# Altium footprint library LukaLIBRARY.PcbLib: 784 footprints (part 25 of 49)
Each footprint in its own frame and in the unit in brackets; x right, y up, seen from the top. Pads: shape width x height; smd on the part's side, far side on the other; paste and mask are expansions set on the pad; w line width, h text height; cw(c..) or ccw(c..) is an arc to the next point about the centre after c.
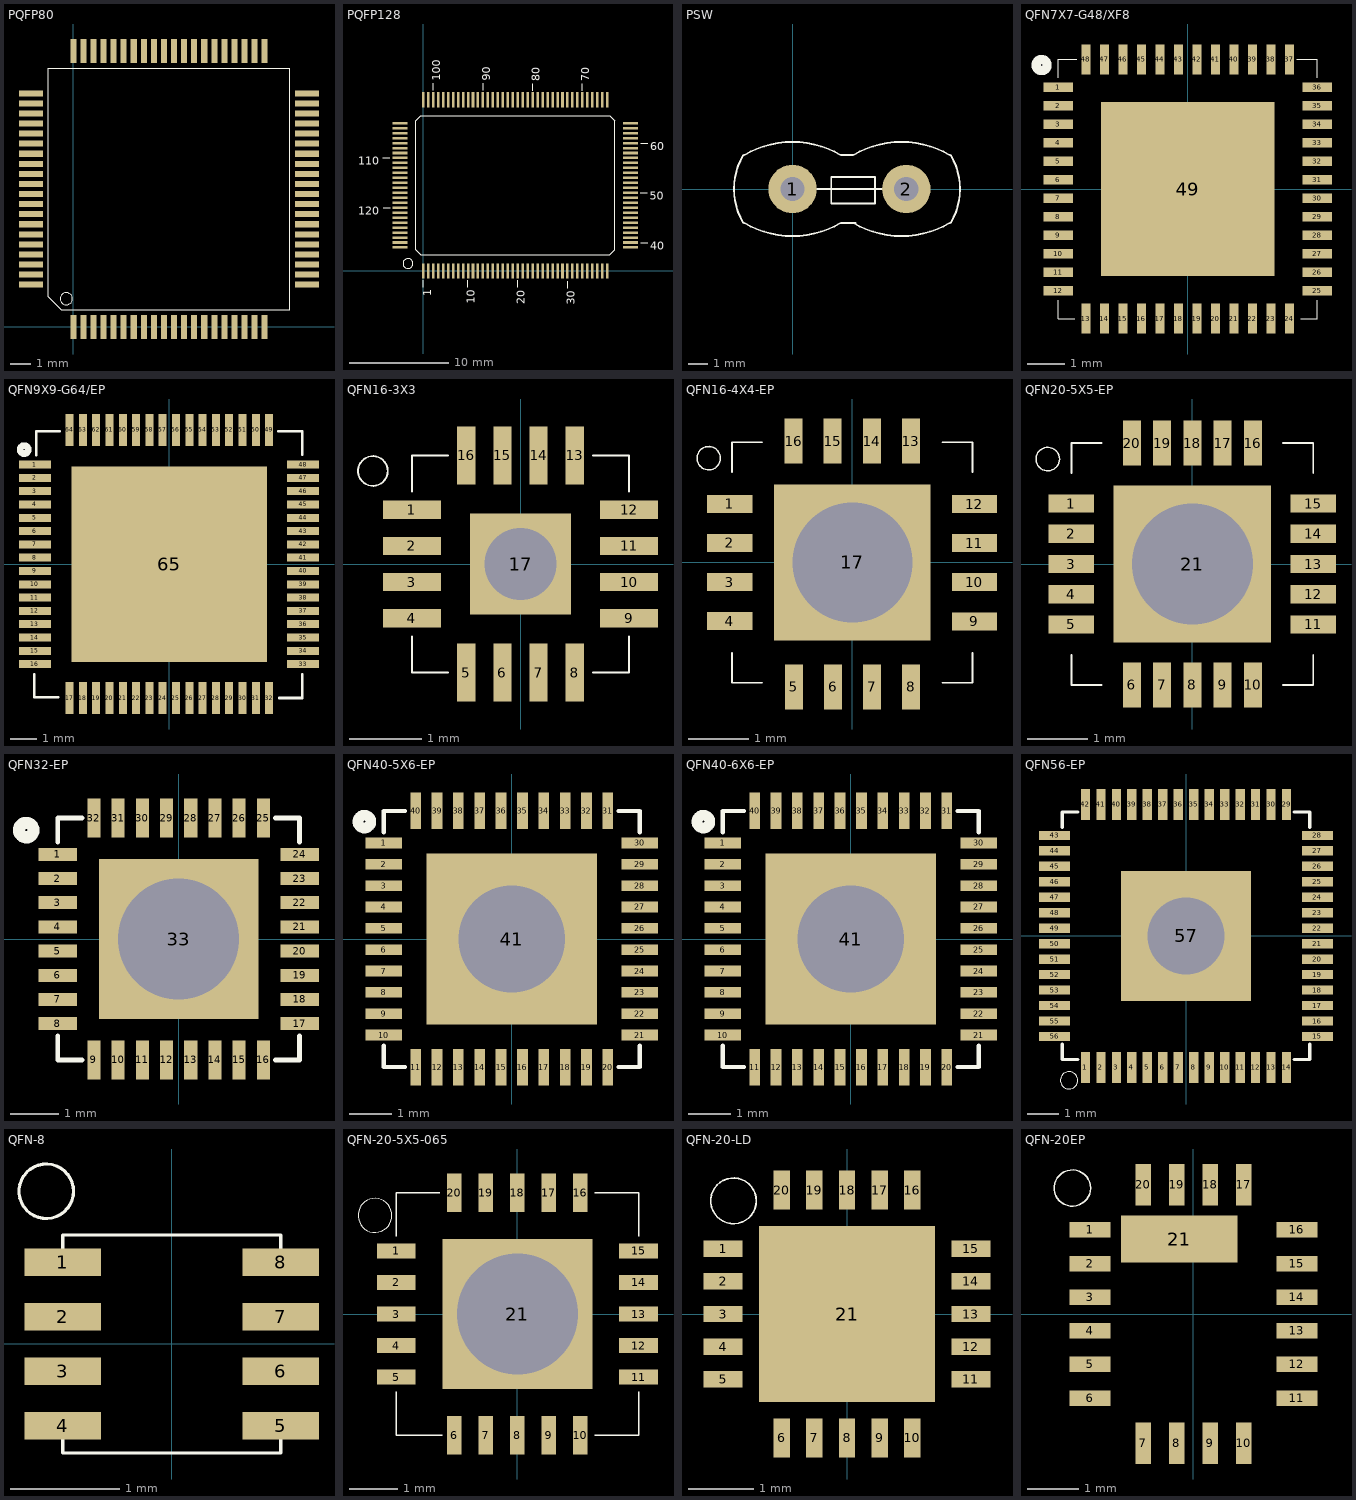
[diagram p24: the footprints below, top view; thin cyan lines are the x and y axes]

## PQFP80 [mm]
pads (80):
  rect 0.3x1.2 smd: 1(0,0) 2(0.5,0) 3(1,0) 4(1.5,0) 5(2,0) 6(2.5,0) 7(3,0) 8(3.5,0) 9(4,0) 10(4.5,0) 11(5,0) 12(5.5,0) 13(6,0) 14(6.5,0) 15(7,0) 16(7.5,0) 17(8,0) 18(8.5,0) 19(9,0) 20(9.5,0) 41(9.5,13.7) 42(9,13.7) 43(8.5,13.7) 44(8,13.7) 45(7.5,13.7) 46(7,13.7) 47(6.5,13.7) 48(6,13.7) 49(5.5,13.7) 50(5,13.7) 51(4.5,13.7) 52(4,13.7) 53(3.5,13.7) 54(3,13.7) 55(2.5,13.7) 56(2,13.7) 57(1.5,13.7) 58(1,13.7) 59(0.5,13.7) 60(0,13.7)
  rect 1.2x0.3 smd: 21(11.6,2.1) 22(11.6,2.6) 23(11.6,3.1) 24(11.6,3.6) 25(11.6,4.1) 26(11.6,4.6) 27(11.6,5.1) 28(11.6,5.6) 29(11.6,6.1) 30(11.6,6.6) 31(11.6,7.1) 32(11.6,7.6) 33(11.6,8.1) 34(11.6,8.6) 35(11.6,9.1) 36(11.6,9.6) 37(11.6,10.1) 38(11.6,10.6) 39(11.6,11.1) 40(11.6,11.6) 61(-2.1,11.6) 62(-2.1,11.1) 63(-2.1,10.6) 64(-2.1,10.1) 65(-2.1,9.6) 66(-2.1,9.1) 67(-2.1,8.6) 68(-2.1,8.1) 69(-2.1,7.6) 70(-2.1,7.1) 71(-2.1,6.6) 72(-2.1,6.1) 73(-2.1,5.6) 74(-2.1,5.1) 75(-2.1,4.6) 76(-2.1,4.1) 77(-2.1,3.6) 78(-2.1,3.1) 79(-2.1,2.6) 80(-2.1,2.1)
Top Overlay:
  circle w0.025: c-0.35,1.4 r0.3
  lines w0.025: -1.25,1.5 -0.6,0.85 10.75,0.85 10.75,12.85 -1.25,12.85 -1.25,1.5

## PQFP128 [mil]
pads (128):
  rect 10x60 smd mask-1000: 1(0,0) 2(19.68,0) 3(39.37,0) 4(59.06,0) 5(78.74,0) 6(98.43,0) 7(118.11,0) 8(137.8,0) 9(157.48,0) 10(177.17,0) 11(196.85,0) 12(216.54,0) 13(236.22,0) 14(255.91,0) 15(275.59,0) 16(295.28,0) 17(314.96,0) 18(334.65,0) 19(354.33,0) 20(374.02,0) 21(393.7,0) 22(413.39,0) 23(433.07,0) 24(452.76,0) 25(472.44,0) 26(492.13,0) 27(511.81,0) 28(531.5,0) 29(551.18,0) 30(570.87,0) 31(590.55,0) 32(610.24,0) 33(629.92,0) 34(649.61,0) 35(669.29,0) 36(688.98,0) 37(708.66,0) 38(728.35,0) 65(728.35,677.17) 66(708.66,677.17) 67(688.98,677.17) 68(669.29,677.17) 69(649.61,677.17) 70(629.92,677.17) 71(610.24,677.17) 72(590.55,677.17) 73(570.87,677.17) 74(551.18,677.17) 75(531.5,677.17) 76(511.81,677.17) 77(492.13,677.17) 78(472.44,677.17) 79(452.76,677.17) 80(433.07,677.17) 81(413.39,677.17) 82(393.7,677.17) 83(374.02,677.17) 84(354.33,677.17) 85(334.65,677.17) 86(314.96,677.17) 87(295.28,677.17) 88(275.59,677.17) 89(255.91,677.17) 90(236.22,677.17) 91(216.54,677.17) 92(196.85,677.17) 93(177.17,677.17) 94(157.48,677.17) 95(137.8,677.17) 96(118.11,677.17) 97(98.43,677.17) 98(78.74,677.17) 99(59.06,677.17) 100(39.37,677.17) 101(19.68,677.17) 102(0,677.17)
  rect 60x10 smd mask-1000: 39(820.87,92.52) 40(820.87,112.2) 41(820.87,131.89) 42(820.87,151.57) 43(820.87,171.26) 44(820.87,190.94) 45(820.87,210.63) 46(820.87,230.31) 47(820.87,250) 48(820.87,269.69) 49(820.87,289.37) 50(820.87,309.06) 51(820.87,328.74) 52(820.87,348.43) 53(820.87,368.11) 54(820.87,387.8) 55(820.87,407.48) 56(820.87,427.17) 57(820.87,446.85) 58(820.87,466.54) 59(820.87,486.22) 60(820.87,505.91) 61(820.87,525.59) 62(820.87,545.28) 63(820.87,564.96) 64(820.87,584.65) 103(-92.52,584.65) 104(-92.52,564.96) 105(-92.52,545.28) 106(-92.52,525.59) 107(-92.52,505.91) 108(-92.52,486.22) 109(-92.52,466.54) 110(-92.52,446.85) 111(-92.52,427.17) 112(-92.52,407.48) 113(-92.52,387.8) 114(-92.52,368.11) 115(-92.52,348.43) 116(-92.52,328.74) 117(-92.52,309.06) 118(-92.52,289.37) 119(-92.52,269.69) 120(-92.52,250) 121(-92.52,230.31) 122(-92.52,210.63) 123(-92.52,190.94) 124(-92.52,171.26) 125(-92.52,151.57) 126(-92.52,131.89) 127(-92.52,112.2) 128(-92.52,92.52)
Top Overlay:
  circle w1: c-60.63,28.94 r19.69
  lines w1: -29.53,82.68 -9.84,62.99 738.19,62.99 757.87,82.68 757.87,594.49 738.19,614.17 -9.84,614.17 -29.53,594.49 -29.53,82.68
  lines w3.94: -160.04,447.64 -132.48,447.64 ; -158.07,249.8 -130.51,249.8 ; 0.39,-64.17 0.39,-36.61 ; 38.78,714.37 38.78,741.93 ; 176.57,-64.17 176.57,-36.61 ; 236.61,714.37 236.61,741.93 ; 373.43,-65.16 373.43,-37.6 ; 433.46,713.39 433.46,740.94 ; 571.26,-68.11 571.26,-40.55 ; 630.32,713.39 630.32,740.94 ; 859.65,308.86 887.2,308.86 ; 860.63,112.01 888.19,112.01 ; 860.63,505.71 888.19,505.71
  text "1" at 30.91,-101.57 h31.25
  text "100" at 66.34,751.77 h31.25
  text "10" at 204.13,-131.1 h31.25
  text "90" at 264.17,751.77 h31.25
  text "30" at 598.82,-135.04 h31.25
  text "70" at 657.87,750.79 h31.25
  text "80" at 461.02,750.79 h31.25
  text "40" at 898.03,84.45 h31.25
  text "60" at 898.03,478.15 h31.25
  text "50" at 897.05,281.3 h31.25
  text "20" at 400.98,-132.09 h31.25
  text "120" at -256.5,222.24 h31.25
  text "110" at -258.46,420.08 h31.25
Top Solder:
  drawing of 128 lines, arcs and shapes, not listed

## PSW [mil]
pads (2):
  round 100 hole 50 mask-1000: 1(0,0) 2(235,0)
Top Overlay:
  lines w3.94: -102.04,-68.94 cw(c15,0) -102.04,68.94 ; -100.1,-69.94 ccw(c0,100) 100.1,-69.94 ; -100.1,69.94 cw(c0,-100) 100.1,69.94 ; 50,0 185,0 ; 100,-70 130,-70 ; 100,70 125,70 ; 124.9,-69.94 ccw(c225,100) 325.1,-69.94 ; 124.9,69.94 cw(c225,-100) 325.1,69.94 ; 327.04,-68.94 ccw(c210,0) 327.04,68.94 ; 80,-30 170,-30 170,25 80,25 80,-30
Top Solder:
  region: 235,50.43 221.95,48.71 209.78,43.67 199.34,35.66 191.33,25.22 186.29,13.05 184.57,0 186.29,-13.05 191.33,-25.22 199.34,-35.66 209.78,-43.67 221.95,-48.71 235,-50.43 248.05,-48.71 260.22,-43.67 270.66,-35.66 278.67,-25.22 283.71,-13.05 285.43,0 283.71,13.05 278.67,25.22 270.66,35.66 260.22,43.67 248.05,48.71
  region: 0,50.43 -13.05,48.71 -25.22,43.67 -35.66,35.66 -43.67,25.22 -48.71,13.05 -50.43,0 -48.71,-13.05 -43.67,-25.22 -35.66,-35.66 -25.22,-43.67 -13.05,-48.71 0,-50.43 13.05,-48.71 25.22,-43.67 35.66,-35.66 43.67,-25.22 48.71,-13.05 50.43,0 48.71,13.05 43.67,25.22 35.66,35.66 25.22,43.67 13.05,48.71
Bottom Solder:
  region: 235,50.43 221.95,48.71 209.78,43.67 199.34,35.66 191.33,25.22 186.29,13.05 184.57,0 186.29,-13.05 191.33,-25.22 199.34,-35.66 209.78,-43.67 221.95,-48.71 235,-50.43 248.05,-48.71 260.22,-43.67 270.66,-35.66 278.67,-25.22 283.71,-13.05 285.43,0 283.71,13.05 278.67,25.22 270.66,35.66 260.22,43.67 248.05,48.71
  region: 0,50.43 -13.05,48.71 -25.22,43.67 -35.66,35.66 -43.67,25.22 -48.71,13.05 -50.43,0 -48.71,-13.05 -43.67,-25.22 -35.66,-35.66 -25.22,-43.67 -13.05,-48.71 0,-50.43 13.05,-48.71 25.22,-43.67 35.66,-35.66 43.67,-25.22 48.71,-13.05 50.43,0 48.71,13.05 43.67,25.22 35.66,35.66 25.22,43.67 13.05,48.71

## QFN7X7-G48/XF8 [mm]
pads (49):
  rect 0.8x0.254 smd mask-25.4: 1(-3.5,2.75) 2(-3.5,2.25) 3(-3.5,1.75) 4(-3.5,1.25) 5(-3.5,0.75) 6(-3.5,0.25) 7(-3.5,-0.25) 8(-3.5,-0.75) 9(-3.5,-1.25) 10(-3.5,-1.75) 11(-3.5,-2.25) 12(-3.5,-2.75) 25(3.5,-2.75) 26(3.5,-2.25) 27(3.5,-1.75) 28(3.5,-1.25) 29(3.5,-0.75) 30(3.5,-0.25) 31(3.5,0.25) 32(3.5,0.75) 33(3.5,1.25) 34(3.5,1.75) 35(3.5,2.25) 36(3.5,2.75)
  rect 0.254x0.8 smd mask-25.4: 13(-2.75,-3.5) 14(-2.25,-3.5) 15(-1.75,-3.5) 16(-1.25,-3.5) 17(-0.75,-3.5) 18(-0.25,-3.5) 19(0.25,-3.5) 20(0.75,-3.5) 21(1.25,-3.5) 22(1.75,-3.5) 23(2.25,-3.5) 24(2.75,-3.5) 37(2.75,3.5) 38(2.25,3.5) 39(1.75,3.5) 40(1.25,3.5) 41(0.75,3.5) 42(0.25,3.5) 43(-0.25,3.5) 44(-0.75,3.5) 45(-1.25,3.5) 46(-1.75,3.5) 47(-2.25,3.5) 48(-2.75,3.5)
  rect 4.7x4.7 smd mask-25.4: 49(0,0)
Top Overlay:
  circle w0.25: c-3.95,3.35 r0.15
  lines w0.025: -3.5,-3 -3.5,-3.5 -3.05,-3.5 ; -3.5,3 -3.5,3.5 -3,3.5 ; 2.95,3.5 3.5,3.5 3.5,3 ; 3.05,-3.5 3.5,-3.5 3.5,-3
Top Solder:
  drawing of 49 lines, arcs and shapes, not listed

## QFN9X9-G64/EP [mm]
pads (65):
  rect 1.2x0.3 smd mask-25.4: 1(-5.05,3.75) 2(-5.05,3.25) 3(-5.05,2.75) 4(-5.05,2.25) 5(-5.05,1.75) 6(-5.05,1.25) 7(-5.05,0.75) 8(-5.05,0.25) 9(-5.05,-0.25) 10(-5.05,-0.75) 11(-5.05,-1.25) 12(-5.05,-1.75) 13(-5.05,-2.25) 14(-5.05,-2.75) 15(-5.05,-3.25) 16(-5.05,-3.75) 33(5.025,-3.75) 34(5.025,-3.25) 35(5.025,-2.75) 36(5.025,-2.25) 37(5.025,-1.75) 38(5.025,-1.25) 39(5.025,-0.75) 40(5.025,-0.25) 41(5.025,0.25) 42(5.025,0.75) 43(5.025,1.25) 44(5.025,1.75) 45(5.025,2.25) 46(5.025,2.75) 47(5.025,3.25) 48(5.025,3.75)
  rect 0.3x1.2 smd mask-25.4: 17(-3.75,-5.025) 18(-3.25,-5.025) 19(-2.75,-5.025) 20(-2.25,-5.025) 21(-1.75,-5.025) 22(-1.25,-5.025) 23(-0.75,-5.025) 24(-0.25,-5.025) 25(0.25,-5.025) 26(0.75,-5.025) 27(1.25,-5.025) 28(1.75,-5.025) 29(2.25,-5.025) 30(2.75,-5.025) 31(3.25,-5.025) 32(3.75,-5.025) 49(3.75,5.05) 50(3.25,5.05) 51(2.75,5.05) 52(2.25,5.05) 53(1.75,5.05) 54(1.25,5.05) 55(0.75,5.05) 56(0.25,5.05) 57(-0.25,5.05) 58(-0.75,5.05) 59(-1.25,5.05) 60(-1.75,5.05) 61(-2.25,5.05) 62(-2.75,5.05) 63(-3.25,5.05) 64(-3.75,5.05)
  rect 7.35x7.35 smd mask-25.4: 65(0,0)
Top Overlay:
  circle w0.25: c-5.455,4.311 r0.15
  lines w0.1: -5.075,-4.125 -5.075,-5 -4.175,-5 ; -5,4.1 -5,5 -4.125,5 ; 4.1,5 5,5 5,4.125 ; 4.125,-5.025 5,-5.025 5,-4.125
Top Solder:
  drawing of 65 lines, arcs and shapes, not listed

## QFN16-3X3 [mm]
pads (17):
  rect 0.8x0.25 smd mask-25.4: 1(-1.5,0.75) 2(-1.5,0.25) 3(-1.5,-0.25) 4(-1.5,-0.75) 9(1.5,-0.75) 10(1.5,-0.25) 11(1.5,0.25) 12(1.5,0.75)
  rect 0.25x0.8 smd mask-25.4: 5(-0.75,-1.5) 6(-0.25,-1.5) 7(0.25,-1.5) 8(0.75,-1.5) 13(0.75,1.5) 14(0.25,1.5) 15(-0.25,1.5) 16(-0.75,1.5)
  rect 1.4x1.4 hole 1 unplated mask-25.4: 17(0,0)
Top Overlay:
  circle w0.025: c-2.04,1.285 r0.206
  lines w0.025: -1.5,-1 -1.5,-1.5 -1,-1.5 ; -1.5,1 -1.5,1.5 -1,1.5 ; 1,-1.5 1.5,-1.5 1.5,-1 ; 1,1.5 1.5,1.5 1.5,1
Top Solder:
  region: -0.7,-0.7 0.7,-0.7 0.7,0.7 -0.7,0.7
  region: 1.9,-0.4 1.9,-0.1 1.1,-0.1 1.1,-0.4
  region: 1.9,0.1 1.9,0.4 1.1,0.4 1.1,0.1
  region: 1.9,0.6 1.9,0.9 1.1,0.9 1.1,0.6
  region: 0.6,1.1 0.9,1.1 0.9,1.9 0.6,1.9
  region: 0.6,-1.9 0.9,-1.9 0.9,-1.1 0.6,-1.1
  region: 1.9,-0.9 1.9,-0.6 1.1,-0.6 1.1,-0.9
  region: 0.1,1.1 0.4,1.1 0.4,1.9 0.1,1.9
  region: -0.4,1.1 -0.1,1.1 -0.1,1.9 -0.4,1.9
  region: -0.6,1.9 -0.9,1.9 -0.9,1.1 -0.6,1.1
  region: -1.1,-0.4 -1.1,-0.1 -1.9,-0.1 -1.9,-0.4
  region: -1.1,0.1 -1.1,0.4 -1.9,0.4 -1.9,0.1
  region: -1.1,0.6 -1.1,0.9 -1.9,0.9 -1.9,0.6
  region: 0.1,-1.9 0.4,-1.9 0.4,-1.1 0.1,-1.1
  region: -0.4,-1.9 -0.1,-1.9 -0.1,-1.1 -0.4,-1.1
  region: -0.6,-1.1 -0.9,-1.1 -0.9,-1.9 -0.6,-1.9
  region: -1.1,-0.9 -1.1,-0.6 -1.9,-0.6 -1.9,-0.9
Bottom Solder:
  region: -0.7,-0.7 0.7,-0.7 0.7,0.7 -0.7,0.7

## QFN16-4X4-EP [mm]
pads (17):
  rect 0.75x0.3 smd mask-25.4: 1(-2.04,0.975) 2(-2.04,0.325) 3(-2.04,-0.325) 4(-2.04,-0.975) 9(2.03,-0.978) 10(2.03,-0.327) 11(2.03,0.323) 12(2.03,0.972)
  rect 0.3x0.75 smd mask-25.4: 5(-0.972,-2.07) 6(-0.323,-2.07) 7(0.327,-2.07) 8(0.978,-2.07) 13(0.972,2.02) 14(0.323,2.02) 15(-0.327,2.02) 16(-0.978,2.02)
  rect 2.6x2.6 hole 2 unplated mask-25.4: 17(0,0)
Top Overlay:
  circle w0.025: c-2.39,1.735 r0.194
  lines w0.03: -2,-1.5 -2,-2 -1.5,-2 ; -2,1.5 -2,2 -1.5,2 ; 1.5,-2 2,-2 2,-1.5 ; 1.5,2 2,2 2,1.5
Top Solder:
  region: -1.665,-0.475 -1.665,-0.175 -2.415,-0.175 -2.415,-0.475
  region: -1.665,-1.125 -1.665,-0.825 -2.415,-0.825 -2.415,-1.125
  region: -0.473,-2.445 -0.173,-2.445 -0.173,-1.695 -0.473,-1.695
  region: -0.823,-1.695 -1.122,-1.695 -1.122,-2.445 -0.823,-2.445
  region: -1.665,0.825 -1.665,1.125 -2.415,1.125 -2.415,0.825
  region: -1.665,0.175 -1.665,0.475 -2.415,0.475 -2.415,0.175
  region: -0.477,1.645 -0.178,1.645 -0.178,2.395 -0.477,2.395
  region: -0.828,2.395 -1.128,2.395 -1.128,1.645 -0.828,1.645
  region: 0.477,-1.695 0.178,-1.695 0.178,-2.445 0.477,-2.445
  region: 2.405,-1.128 2.405,-0.828 1.655,-0.828 1.655,-1.128
  region: 2.405,-0.477 2.405,-0.178 1.655,-0.178 1.655,-0.477
  region: 0.828,-2.445 1.128,-2.445 1.128,-1.695 0.828,-1.695
  region: 0.473,2.395 0.173,2.395 0.173,1.645 0.473,1.645
  region: 2.405,0.173 2.405,0.473 1.655,0.473 1.655,0.173
  region: 2.405,0.823 2.405,1.122 1.655,1.122 1.655,0.823
  region: 1.122,2.395 0.823,2.395 0.823,1.645 1.122,1.645
  region: -1.3,-1.3 1.3,-1.3 1.3,1.3 -1.3,1.3
Bottom Solder:
  region: -1.5,-1.5 1.5,-1.5 1.5,1.5 -1.5,1.5

## QFN20-5X5-EP [mm]
pads (21):
  rect 0.75x0.3 smd mask-25.4: 1(-2,1) 2(-2,0.5) 3(-2,0) 4(-2,-0.5) 5(-2,-1) 11(2,-1) 12(2,-0.5) 13(2,0) 14(2,0.5) 15(2,1)
  rect 0.3x0.75 smd mask-25.4: 6(-1,-2) 7(-0.5,-2) 8(0,-2) 9(0.5,-2) 10(1,-2) 16(1,2) 17(0.5,2) 18(0,2) 19(-0.5,2) 20(-1,2)
  rect 2.6x2.6 hole 2 unplated mask-25.4: 21(0,0)
Top Overlay:
  circle w0.025: c-2.39,1.735 r0.194
  lines w0.03: -2,-1.5 -2,-2 -1.5,-2 ; -2,1.5 -2,2 -1.5,2 ; 1.5,-2 2,-2 2,-1.5 ; 1.5,2 2,2 2,1.5
Top Solder:
  region: -1.3,-1.3 1.3,-1.3 1.3,1.3 -1.3,1.3
  region: 0.15,2.375 -0.15,2.375 -0.15,1.625 0.15,1.625
  region: -0.15,-2.375 0.15,-2.375 0.15,-1.625 -0.15,-1.625
  region: 1.625,0.15 1.625,-0.15 2.375,-0.15 2.375,0.15
  region: -1.625,-0.15 -1.625,0.15 -2.375,0.15 -2.375,-0.15
  region: 0.65,2.375 0.35,2.375 0.35,1.625 0.65,1.625
  region: 1.15,2.375 0.85,2.375 0.85,1.625 1.15,1.625
  region: 2.375,0.85 2.375,1.15 1.625,1.15 1.625,0.85
  region: 1.625,0.65 1.625,0.35 2.375,0.35 2.375,0.65
  region: 2.375,-0.65 2.375,-0.35 1.625,-0.35 1.625,-0.65
  region: 2.375,-1.15 2.375,-0.85 1.625,-0.85 1.625,-1.15
  region: 1.15,-1.625 0.85,-1.625 0.85,-2.375 1.15,-2.375
  region: 0.65,-1.625 0.35,-1.625 0.35,-2.375 0.65,-2.375
  region: -0.85,2.375 -1.15,2.375 -1.15,1.625 -0.85,1.625
  region: -0.35,2.375 -0.65,2.375 -0.65,1.625 -0.35,1.625
  region: -1.625,0.35 -1.625,0.65 -2.375,0.65 -2.375,0.35
  region: -1.625,0.85 -1.625,1.15 -2.375,1.15 -2.375,0.85
  region: -0.35,-1.625 -0.65,-1.625 -0.65,-2.375 -0.35,-2.375
  region: -1.15,-2.375 -0.85,-2.375 -0.85,-1.625 -1.15,-1.625
  region: -1.625,-1.15 -1.625,-0.85 -2.375,-0.85 -2.375,-1.15
  region: -1.625,-0.65 -1.625,-0.35 -2.375,-0.35 -2.375,-0.65
Bottom Solder:
  region: -1.5,-1.5 1.5,-1.5 1.5,1.5 -1.5,1.5

## QFN32-EP [mm]
pads (33):
  rect 0.8x0.27 smd: 1(-2.5,1.75) 2(-2.5,1.25) 3(-2.5,0.75) 4(-2.5,0.25) 5(-2.5,-0.25) 6(-2.5,-0.75) 7(-2.5,-1.25) 8(-2.5,-1.75) 17(2.5,-1.75) 18(2.5,-1.25) 19(2.5,-0.75) 20(2.5,-0.25) 21(2.5,0.25) 22(2.5,0.75) 23(2.5,1.25) 24(2.5,1.75)
  rect 0.27x0.8 smd: 9(-1.75,-2.5) 10(-1.25,-2.5) 11(-0.75,-2.5) 12(-0.25,-2.5) 13(0.25,-2.5) 14(0.75,-2.5) 15(1.25,-2.5) 16(1.75,-2.5) 25(1.75,2.5) 26(1.25,2.5) 27(0.75,2.5) 28(0.25,2.5) 29(-0.25,2.5) 30(-0.75,2.5) 31(-1.25,2.5) 32(-1.75,2.5)
  rect 3.3x3.3 on Top hole 2.5 unplated: 33(0,0)
Top Overlay:
  circle w0.25: c-3.15,2.25 r0.15
  lines w0.1: -2.5,-2 -2.5,-2.5 -2,-2.5 ; -2.5,2 -2.5,2.5 -2,2.5 ; 2,-2.5 2.5,-2.5 2.5,-2 ; 2,2.5 2.5,2.5 2.5,2

## QFN40-5X6-EP [mm]
pads (41):
  rect 0.85x0.25 smd: 1(-3,2.25) 2(-3,1.75) 3(-3,1.25) 4(-3,0.75) 5(-3,0.25) 6(-3,-0.25) 7(-3,-0.75) 8(-3,-1.25) 9(-3,-1.75) 10(-3,-2.25) 21(3,-2.25) 22(3,-1.75) 23(3,-1.25) 24(3,-0.75) 25(3,-0.25) 26(3,0.25) 27(3,0.75) 28(3,1.25) 29(3,1.75) 30(3,2.25)
  rect 0.25x0.85 smd: 11(-2.25,-3) 12(-1.75,-3) 13(-1.25,-3) 14(-0.75,-3) 15(-0.25,-3) 16(0.25,-3) 17(0.75,-3) 18(1.25,-3) 19(1.75,-3) 20(2.25,-3) 31(2.25,3) 32(1.75,3) 33(1.25,3) 34(0.75,3) 35(0.25,3) 36(-0.25,3) 37(-0.75,3) 38(-1.25,3) 39(-1.75,3) 40(-2.25,3)
  rect 4x4 hole 2.5 unplated mask-25.4: 41(0,0)
Top Overlay:
  circle w0.25: c-3.45,2.75 r0.15
  lines w0.1: -3,-2.5 -3,-3 -2.5,-3 ; -3,2.5 -3,3 -2.5,3 ; 2.5,-3 3,-3 3,-2.5 ; 2.5,3 3,3 3,2.5
Top Solder:
  region: 2,-2 2,2 -2,2 -2,-2
Bottom Solder:
  region: -2.01,0 -1.971,-0.392 -1.857,-0.769 -1.671,-1.117 -1.421,-1.421 -1.117,-1.671 -0.769,-1.857 -0.392,-1.971 0,-2.01 0.392,-1.971 0.769,-1.857 1.117,-1.671 1.421,-1.421 1.671,-1.117 1.857,-0.769 1.971,-0.392 2.01,0 1.971,0.392 1.857,0.769 1.671,1.117 1.421,1.421 1.117,1.671 0.769,1.857 0.392,1.971 0,2.01 -0.392,1.971 -0.769,1.857 -1.117,1.671 -1.421,1.421 -1.671,1.117 -1.857,0.769 -1.971,0.392

## QFN40-6X6-EP [mm]
pads (41):
  rect 0.85x0.25 smd: 1(-3,2.25) 2(-3,1.75) 3(-3,1.25) 4(-3,0.75) 5(-3,0.25) 6(-3,-0.25) 7(-3,-0.75) 8(-3,-1.25) 9(-3,-1.75) 10(-3,-2.25) 21(3,-2.25) 22(3,-1.75) 23(3,-1.25) 24(3,-0.75) 25(3,-0.25) 26(3,0.25) 27(3,0.75) 28(3,1.25) 29(3,1.75) 30(3,2.25)
  rect 0.25x0.85 smd: 11(-2.25,-3) 12(-1.75,-3) 13(-1.25,-3) 14(-0.75,-3) 15(-0.25,-3) 16(0.25,-3) 17(0.75,-3) 18(1.25,-3) 19(1.75,-3) 20(2.25,-3) 31(2.25,3) 32(1.75,3) 33(1.25,3) 34(0.75,3) 35(0.25,3) 36(-0.25,3) 37(-0.75,3) 38(-1.25,3) 39(-1.75,3) 40(-2.25,3)
  rect 4x4 hole 2.5 unplated mask-25.4: 41(0,0)
Top Overlay:
  circle w0.25: c-3.45,2.75 r0.15
  lines w0.1: -3,-2.5 -3,-3 -2.5,-3 ; -3,2.5 -3,3 -2.5,3 ; 2.5,-3 3,-3 3,-2.5 ; 2.5,3 3,3 3,2.5
Top Solder:
  region: 2,-2 2,2 -2,2 -2,-2
Bottom Solder:
  region: -2.01,0 -1.971,-0.392 -1.857,-0.769 -1.671,-1.117 -1.421,-1.421 -1.117,-1.671 -0.769,-1.857 -0.392,-1.971 0,-2.01 0.392,-1.971 0.769,-1.857 1.117,-1.671 1.421,-1.421 1.671,-1.117 1.857,-0.769 1.971,-0.392 2.01,0 1.971,0.392 1.857,0.769 1.671,1.117 1.421,1.421 1.117,1.671 0.769,1.857 0.392,1.971 0,2.01 -0.392,1.971 -0.769,1.857 -1.117,1.671 -1.421,1.421 -1.671,1.117 -1.857,0.769 -1.971,0.392

## QFN56-EP [mm]
pads (57):
  rect 0.3x1 smd mask-25.4: 1(-3.25,-4.25) 2(-2.75,-4.25) 3(-2.25,-4.25) 4(-1.75,-4.25) 5(-1.25,-4.25) 6(-0.75,-4.25) 7(-0.25,-4.25) 8(0.25,-4.25) 9(0.75,-4.25) 10(1.25,-4.25) 11(1.75,-4.25) 12(2.25,-4.25) 13(2.75,-4.25) 14(3.25,-4.25) 29(3.25,4.25) 30(2.75,4.25) 31(2.25,4.25) 32(1.75,4.25) 33(1.25,4.25) 34(0.75,4.25) 35(0.25,4.25) 36(-0.25,4.25) 37(-0.75,4.25) 38(-1.25,4.25) 39(-1.75,4.25) 40(-2.25,4.25) 41(-2.75,4.25) 42(-3.25,4.25)
  rect 1x0.3 smd mask-25.4: 15(4.25,-3.25) 16(4.25,-2.75) 17(4.25,-2.25) 18(4.25,-1.75) 19(4.25,-1.25) 20(4.25,-0.75) 21(4.25,-0.25) 22(4.25,0.25) 23(4.25,0.75) 24(4.25,1.25) 25(4.25,1.75) 26(4.25,2.25) 27(4.25,2.75) 28(4.25,3.25) 43(-4.25,3.25) 44(-4.25,2.75) 45(-4.25,2.25) 46(-4.25,1.75) 47(-4.25,1.25) 48(-4.25,0.75) 49(-4.25,0.25) 50(-4.25,-0.25) 51(-4.25,-0.75) 52(-4.25,-1.25) 53(-4.25,-1.75) 54(-4.25,-2.25) 55(-4.25,-2.75) 56(-4.25,-3.25)
  rect 4.2x4.2 hole 2.5 unplated mask-25.4: 57(0,0)
Top Overlay:
  circle w0.025: c-3.78,-4.67 r0.278
  lines w0.1: -4,-3.5 -4,-4 -3.5,-4 ; -4,3.5 -4,4 -3.5,4 ; 3.5,-4 4,-4 4,-3.5 ; 3.5,4 4,4 4,3.5
Top Solder:
  drawing of 57 lines, arcs and shapes, not listed
Bottom Solder:
  region: 2.1,-2.1 2.1,2.1 -2.1,2.1 -2.1,-2.1

## QFN-8 [mm]
pads (8):
  rect 0.7x0.25 smd mask-25.4: 1(-1,0.75) 2(-1,0.25) 3(-1,-0.25) 4(-1,-0.75) 5(1,-0.75) 6(1,-0.25) 7(1,0.25) 8(1,0.75)
Top Overlay:
  circle w0.03: c-1.15,1.4 r0.25
  lines w0.03: -1,-0.85 -1,-1 1,-1 1,-0.85 ; -1,0.85 -1,1 1,1 1,0.85
Top Solder:
  region: 0.65,0.625 1.35,0.625 1.35,0.875 0.65,0.875
  region: 0.65,0.125 1.35,0.125 1.35,0.375 0.65,0.375
  region: 0.65,-0.375 1.35,-0.375 1.35,-0.125 0.65,-0.125
  region: 0.65,-0.875 1.35,-0.875 1.35,-0.625 0.65,-0.625
  region: -1.35,0.625 -0.65,0.625 -0.65,0.875 -1.35,0.875
  region: -1.35,-0.875 -0.65,-0.875 -0.65,-0.625 -1.35,-0.625
  region: -1.35,-0.375 -0.65,-0.375 -0.65,-0.125 -1.35,-0.125
  region: -1.35,0.125 -0.65,0.125 -0.65,0.375 -1.35,0.375

## QFN-20-5X5-065 [mm]
pads (21):
  rect 0.8x0.3 smd mask-25.4: 1(-2.5,1.3) 2(-2.5,0.65) 3(-2.5,0) 4(-2.5,-0.65) 5(-2.5,-1.3) 11(2.5,-1.3) 12(2.5,-0.65) 13(2.5,0) 14(2.5,0.65) 15(2.5,1.3)
  rect 0.3x0.8 smd mask-25.4: 6(-1.3,-2.5) 7(-0.65,-2.5) 8(0,-2.5) 9(0.65,-2.5) 10(1.3,-2.5) 16(1.3,2.5) 17(0.65,2.5) 18(0,2.5) 19(-0.65,2.5) 20(-1.3,2.5)
  rect 3.1x3.1 hole 2.5 unplated mask-25.4: 21(0,0)
Top Overlay:
  circle w0.025: c-2.94,2.035 r0.35
  lines w0.03: -2.5,-1.6 -2.5,-2.5 -1.55,-2.5 ; -2.5,1.6 -2.5,2.5 -1.6,2.5 ; 1.6,-2.5 2.5,-2.5 2.5,-1.6 ; 1.6,2.5 2.5,2.5 2.5,1.6
Top Solder:
  region: -1.35,-1.35 1.35,-1.35 1.35,1.35 -1.35,1.35
  region: 0.5,2.1 0.8,2.1 0.8,2.9 0.5,2.9
  region: 0.5,-2.9 0.8,-2.9 0.8,-2.1 0.5,-2.1
  region: 2.1,0.8 2.1,0.5 2.9,0.5 2.9,0.8
  region: -2.1,0.5 -2.1,0.8 -2.9,0.8 -2.9,0.5
  region: 1.15,2.1 1.45,2.1 1.45,2.9 1.15,2.9
  region: 2.1,1.45 2.1,1.15 2.9,1.15 2.9,1.45
  region: 2.1,-1.15 2.1,-1.45 2.9,-1.45 2.9,-1.15
  region: 2.1,-0.5 2.1,-0.8 2.9,-0.8 2.9,-0.5
  region: 2.1,0.15 2.1,-0.15 2.9,-0.15 2.9,0.15
  region: 1.15,-2.9 1.45,-2.9 1.45,-2.1 1.15,-2.1
  region: -0.15,2.1 0.15,2.1 0.15,2.9 -0.15,2.9
  region: -0.8,2.1 -0.5,2.1 -0.5,2.9 -0.8,2.9
  region: -1.45,2.1 -1.15,2.1 -1.15,2.9 -1.45,2.9
  region: -2.1,1.15 -2.1,1.45 -2.9,1.45 -2.9,1.15
  region: -2.1,-1.45 -2.1,-1.15 -2.9,-1.15 -2.9,-1.45
  region: -2.1,-0.8 -2.1,-0.5 -2.9,-0.5 -2.9,-0.8
  region: -2.1,-0.15 -2.1,0.15 -2.9,0.15 -2.9,-0.15
  region: -0.15,-2.9 0.15,-2.9 0.15,-2.1 -0.15,-2.1
  region: -1.15,-2.1 -1.45,-2.1 -1.45,-2.9 -1.15,-2.9
  region: -0.8,-2.9 -0.5,-2.9 -0.5,-2.1 -0.8,-2.1
Bottom Solder:
  region: -1.55,-1.55 1.55,-1.55 1.55,1.55 -1.55,1.55

## QFN-20-LD [mm]
pads (21):
  rect 0.6x0.25 smd mask-25.4: 1(-1.9,1) 2(-1.9,0.5) 3(-1.9,0) 4(-1.9,-0.5) 5(-1.9,-1) 11(1.9,-1) 12(1.9,-0.5) 13(1.9,0) 14(1.9,0.5) 15(1.9,1)
  rect 0.25x0.6 smd mask-25.4: 6(-1,-1.9) 7(-0.5,-1.9) 8(0,-1.9) 9(0.5,-1.9) 10(1,-1.9) 16(1,1.9) 17(0.5,1.9) 18(0,1.9) 19(-0.5,1.9) 20(-1,1.9)
  rect 2.7x2.7 smd mask-25.4: 21(0,0)
Top Overlay:
  circle w0.025: c-1.74,1.735 r0.35
Top Solder:
  region: -1.35,-1.35 1.35,-1.35 1.35,1.35 -1.35,1.35
  region: -1.5,-0.65 -1.5,-0.35 -2.3,-0.35 -2.3,-0.65
  region: 1.5,-0.35 1.5,-0.65 2.3,-0.65 2.3,-0.35
  region: -1.5,-0.15 -1.5,0.15 -2.3,0.15 -2.3,-0.15
  region: -1.5,0.35 -1.5,0.65 -2.3,0.65 -2.3,0.35
  region: -1.5,0.85 -1.5,1.15 -2.3,1.15 -2.3,0.85
  region: 1.5,1.15 1.5,0.85 2.3,0.85 2.3,1.15
  region: 1.5,0.65 1.5,0.35 2.3,0.35 2.3,0.65
  region: 1.5,0.15 1.5,-0.15 2.3,-0.15 2.3,0.15
  region: -1.15,1.5 -0.85,1.5 -0.85,2.3 -1.15,2.3
  region: -0.65,1.5 -0.35,1.5 -0.35,2.3 -0.65,2.3
  region: -0.15,1.5 0.15,1.5 0.15,2.3 -0.15,2.3
  region: 0.35,1.5 0.65,1.5 0.65,2.3 0.35,2.3
  region: 0.85,1.5 1.15,1.5 1.15,2.3 0.85,2.3
  region: -1.5,-1.15 -1.5,-0.85 -2.3,-0.85 -2.3,-1.15
  region: 1.5,-0.85 1.5,-1.15 2.3,-1.15 2.3,-0.85
  region: 0.85,-2.3 1.15,-2.3 1.15,-1.5 0.85,-1.5
  region: 0.35,-2.3 0.65,-2.3 0.65,-1.5 0.35,-1.5
  region: -0.15,-2.3 0.15,-2.3 0.15,-1.5 -0.15,-1.5
  region: -0.65,-2.3 -0.35,-2.3 -0.35,-1.5 -0.65,-1.5
  region: -0.85,-1.5 -1.15,-1.5 -1.15,-2.3 -0.85,-2.3

## QFN-20EP [mm]
pads (21):
  rect 0.8x0.3 smd mask-25.4: 1(-2,1.625) 2(-2,0.975) 3(-2,0.325) 4(-2,-0.325) 5(-2,-0.975) 6(-2,-1.625) 11(2,-1.625) 12(2,-0.975) 13(2,-0.325) 14(2,0.325) 15(2,0.975) 16(2,1.625)
  rect 0.3x0.8 smd mask-25.4: 7(-0.975,-2.5) 8(-0.325,-2.5) 9(0.325,-2.5) 10(0.975,-2.5) 17(0.975,2.5) 18(0.325,2.5) 19(-0.325,2.5) 20(-0.975,2.5)
  rect 2.25x0.9 smd mask-25.4: 21(-0.275,1.45)
Top Overlay:
  circle w0.025: c-2.34,2.435 r0.35
Top Solder:
  region: -1.4,1 0.85,1 0.85,1.9 -1.4,1.9
  region: -0.475,2.1 -0.175,2.1 -0.175,2.9 -0.475,2.9
  region: -0.475,-2.9 -0.175,-2.9 -0.175,-2.1 -0.475,-2.1
  region: 1.6,0.475 1.6,0.175 2.4,0.175 2.4,0.475
  region: -1.6,0.175 -1.6,0.475 -2.4,0.475 -2.4,0.175
  region: 1.6,1.775 1.6,1.475 2.4,1.475 2.4,1.775
  region: 1.6,1.125 1.6,0.825 2.4,0.825 2.4,1.125
  region: 0.825,2.1 1.125,2.1 1.125,2.9 0.825,2.9
  region: 0.175,2.1 0.475,2.1 0.475,2.9 0.175,2.9
  region: 0.825,-2.9 1.125,-2.9 1.125,-2.1 0.825,-2.1
  region: 1.6,-0.175 1.6,-0.475 2.4,-0.475 2.4,-0.175
  region: 1.6,-0.825 1.6,-1.125 2.4,-1.125 2.4,-0.825
  region: 1.6,-1.475 1.6,-1.775 2.4,-1.775 2.4,-1.475
  region: 0.175,-2.9 0.475,-2.9 0.475,-2.1 0.175,-2.1
  region: -1.6,1.475 -1.6,1.775 -2.4,1.775 -2.4,1.475
  region: -1.6,0.825 -1.6,1.125 -2.4,1.125 -2.4,0.825
  region: -1.125,2.1 -0.825,2.1 -0.825,2.9 -1.125,2.9
  region: -1.6,-0.475 -1.6,-0.175 -2.4,-0.175 -2.4,-0.475
  region: -1.6,-1.125 -1.6,-0.825 -2.4,-0.825 -2.4,-1.125
  region: -1.6,-1.775 -1.6,-1.475 -2.4,-1.475 -2.4,-1.775
  region: -1.125,-2.9 -0.825,-2.9 -0.825,-2.1 -1.125,-2.1